# Altium integrated library Altium_Library_Harish.IntLib: 425 symbols (part 1 of 4) (continued)
## DIO-TVS_5.6V Vbr_18.6V Vc_9.4A Ip_SOD-923 (continued)
ESD Suppressor Diode TVS Bi-Dir 5V 18.6Vc 2-Pin SOD-923F T/R; Manufacturer: Comchip; Min Breakdown Voltage: 5.6V; Clamping Voltage: 7.3V; Peak Pulse Power: 174W; Power Line Protection: No; Peak Pulse Current: 9.4A; Diode Type: ZENER; Capacitance: 15pF; Number of Bidirectional Channels: 1; Supplier 1: Digi-Key; Manufacturer Part Number: CPDQ5V0-HF; RoHS: Yes; Category: TVS Diodes; Stock 1: 81421; Pricing 1: 1=0.31, 10=0.252, 100=0.1337, 500=0.08794, 1000=0.0598, 2000=0.05394 (USD); Mount: Surface Mount; Case/Package: 0402; Min Operating Temperature: -40°C; Max Operating Temperature: 125°C; Packaging: Tape and Reel; Package Quantity: 8000; Reverse Standoff Voltage: 5V; Breakdown Voltage: 5.6V; Series: -; Operating Supply Voltage: 5V; RoHS Compliant: Yes; ComponentLink1URL: https://datasheet.ciiva.com/6577/cpdq5v0-hf20reva825126-6577872.pdf?src-supplier=Digi-Key; ComponentLink1Description: https://datasheet.ciiva.com/6577/cpdq5v0-hf20reva825126-6577872.pdf?src-supplier=Digi-Key; ComponentLink2URL: https://datasheet.ciiva.com/12545/cpdq5v0-hf20reva825126-218795-12545530.pdf?src-supplier=Mouser; ComponentLink2Description: https://datasheet.ciiva.com/12545/cpdq5v0-hf20reva825126-218795-12545530.pdf?src-supplier=Mouser; Supplier 2: Digi-Key; Manufacturer 2: Comchip; Manufacturer Part Number 2: CPDQ5V0-HF; Stock 2: 80696; Pricing 2: 1=0.31, 10=0.214, 100=0.1042, 500=0.08692, 1000=0.0604, 2000=0.05235 (USD); Supplier Part Number 2: 641-1478-1-ND
footprint SOD-923F (SODFL, 2-Leads, Body 0.60x1.00mm, IPC Medium Density)
pins: 1, 2 "1"

## DIO-TVS_5V_7A_5Array_SC-89(SOT-666)
designator D?, comment UCLAMP0505A.TCT
Trans Voltage Suppressor Diode, 100W, 5V V(RWM), Unidirectional, 5 Element, Silicon; Manufacturer: Semtech; Package Body Material: Plastic; Min Breakdown Voltage: 6V; Clamping Voltage-Max: 12V; Number of Elements: 5; Qualification Status: Not Qualified; Supplier: Digi-Key; Supplier Part Number: UCLAMP0505ACT-ND; Manufacturer Part Number: UCLAMP0505A.TCT; RoHS: Yes; Category: TVS Diodes; Stock: 14139; Pricing: 1=0.76, 10=0.656, 100=0.4545, 500=0.37976, 1000=0.3232 (USD); Pins: 6; Diode Element Material: SILICON; Package Shape: Rectangular; Terminal Finish: Tin; Min Operating Temperature: -55°C; Max Operating Temperature: 125°C; JESD-609 Code: e3; Polarity: Unidirectional; Diode Type: TRANS VOLTAGE SUPPRESSOR; JESD-30 Code: R-PDSO-F6; Moisture Sensitivity Level: 1; Non-rep Peak Rev Power Dis-Max: 100W; Package Style: SMALL OUTLINEMeter; Peak Reflow Temperature (Cel): 260°C; Rep Pk Reverse Voltage-Max: 5V; Surface Mount: Yes; Technology: AVALANCHE; Terminal Form: Flat; Terminal Position: DUAL; Reach SVHC Compliant: Yes; RoHS Compliant: Yes; ComponentLink1URL: https://datasheet.ciiva.com:443/pdfs/VipMasterIC/IC/SEMT/SEMT-S-A0000084877/SEMT-S-A0000084877-1.pdf?src-supplier=IHS+Markit; ComponentLink1Description: https://datasheet.ciiva.com:443/pdfs/VipMasterIC/IC/SEMT/SEMT-S-A0000084877/SEMT-S-A0000084877-1.pdf?src-supplier=IHS+Markit; ComponentLink2URL: https://datasheet.ciiva.com/26837/getdatasheetpartid-215864-26837202.pdf?src-supplier=Verical; ComponentLink2Description: https://datasheet.ciiva.com/26837/getdatasheetpartid-215864-26837202.pdf?src-supplier=Verical; ComponentLink3URL: https://datasheet.ciiva.com/11195/uclamp0505a-11195109.pdf?src-supplier=Avnet; ComponentLink3Description: https://datasheet.ciiva.com/11195/uclamp0505a-11195109.pdf?src-supplier=Avnet
pins: 1, 2, 3, 4, 5, 6

## DIO_100V_215mA_SOD882D BAS16LD,315
designator D?  (value not drawn)
DIODE GP 100V 215MA SOD882D; Manufacturer: Nexperia; Manufacturer Part Number: BAS16LD,315; Supplier 1: Future Electronics; RoHS: Yes; Category: Rectifier Diodes; Stock 1: 50000; Pricing 1: 10000=0.0289, 30000=0.0279, 40000=0.0276, 100000=0.0268, 150000=0.026 (USD); Supplier 2: Digi-Key; Manufacturer 2: Nexperia; Manufacturer Part Number 2: BAS16LD,315; Stock 2: 431411; Pricing 2: 1=0.26, 10=0.215, 100=0.114, 500=0.075, 1000=0.05099, 2000=0.046, 5000=0.04 (USD); Supplier Part Number 2: 1727-4421-1-ND
footprint BAS16LD,315 Diode
pins: 1, 2
text: A; K

## DIO_ESD_USBLC6-25C6Y ESD Protection USB
designator D?, comment USBLC6-2SC6Y  (value not drawn)
USBLC6 Series 2 Line 6 V Uni / Bi-Directional ESD Protection - SOT-23-6; Manufacturer: STMicroelectronics; Direction: Unidirectional,Bidirectional; Reverse Standoff Voltage: 5.25V; Min Breakdown Voltage: 6V; Power Line Protection: Yes; Peak Pulse Current: 5A; Capacitance: 3.5pF; Clamping Voltage: 17V; Leakage Current: 150nA; Operating Supply Voltage: 1.1V; Number of Channels: 2; Working Voltage: 5V; Test Current: 1mA; Number of Elements: 1; Data Rate: 480Mbps; Supplier 1: Mouser; Manufacturer Part Number: USBLC6-2SC6; RoHS: Yes; Category: TVS Diodes; Stock 1: 215645; Pricing 1: 1=0.59, 10=0.507, 50=0.507, 100=0.379, 1000=0.23, 10000=0.182 (USD); Mount: Surface Mount; Case/Package: SOT-23; Number of Pins: 6; Min Operating Temperature: -40°C; Max Operating Temperature: 125°C; Packaging: Tape and Reel; Series: USB; Breakdown Voltage: 6V; Package Quantity: 3000; Termination: SMD/SMT; Number of Bidirectional Channels: 2; ESD Protection: Yes; Max Reverse Leakage Current: 150nA; Reverse Breakdown Voltage: 6V; Polarity: Unidirectional,Bidirectional; Max Breakdown Voltage: 6V; Clamping Voltage-Max: 17V; Length: 3.05mm; Width: 1.75mm; Height: 1.3mm; Depth: 1.75mm; Radiation Hardening: No; RoHS Compliant: Yes; Lead Free: Lead Free; Reach SVHC Compliant: No; ComponentLink1URL: https://datasheet.ciiva.com/1268/1690354-1268384.pdf?src-supplier=Element14; ComponentLink1Description: https://datasheet.ciiva.com/1268/1690354-1268384.pdf?src-supplier=Element14; ComponentLink2URL: https://datasheet.ciiva.com/4508/cd00050750-113117-4508433.pdf?src-supplier=Mouser; ComponentLink2Description: https://datasheet.ciiva.com/4508/cd00050750-113117-4508433.pdf?src-supplier=Mouser; ComponentLink3URL: https://datasheet.ciiva.com/15143/getdatasheetpartid-148465-15143789.pdf?src-supplier=Verical; ComponentLink3Description: https://datasheet.ciiva.com/15143/getdatasheetpartid-148465-15143789.pdf?src-supplier=Verical; ComponentLink4URL: https://datasheet.ciiva.com/16200/cd00050750-16200026.pdf?src-supplier=Future+Electronics; ComponentLink4Description: https://datasheet.ciiva.com/16200/cd00050750-16200026.pdf?src-supplier=Future+Electronics; ComponentLink5URL: https://datasheet.ciiva.com/41444/001184109-da-01-en-ic-esd-protecti-usblc6-2sc6-sot-23-6-stm-41444156.pdf?src-supplier=Conrad; ComponentLink5Description: https://datasheet.ciiva.com/41444/001184109-da-01-en-ic-esd-protecti-usblc6-2sc6-sot-23-6-stm-41444156.pdf?src-supplier=Conrad
pins: 1 I/O1 (io), 2 GND, 3 I/O2 (io), 4 I/O2, 5 VBUS, 6 I/O1 (io)

## DIO_REC_100V_200mA_SOD-323
designator DS?, comment BAS416-HF
Diode Switching 85V 200MA 250MW; Manufacturer: Comchip; Supplier: DigiKey; Supplier Part Number: 641-BAS416-HFCT-ND; Manufacturer Part Number: BAS416-HF; Stock: 2730; Pricing: 1=0.21, 10=0.146, 100=0.0711, 500=0.0593, 1000=0.04121 (USD)
footprint SOD-323
pins: 1, 2
text: A; K

## DIO_RECT_1000V_1A_DIO214AC
designator DS?, comment M7 1N4007
Diode 1000 V 1A Surface Mount SMA/DO-214AC
footprint DIO214AC
footprint DIO214AC
pins: 1, 2
text: A; K

## DIO_RECT_1000V_1A_DO-214AC
designator DS?, comment RS1M
Rectifier Diode, 1 Element, 1A, 1000V V(RRM), Silicon, DO-214AC; Manufacturer: ON Semiconductor / Fairchild; Reverse Recovery Time: 500ns; Max Reverse Voltage (DC): 1kV; Max Reverse Current: 5uA; Forward Voltage: 1.3V; Peak Non-Repetitive Surge Current: 30A; Polarity: Standard; Capacitance: 10pF; Power Dissipation: 1.19W; Supplier 1: Digi-Key; Manufacturer Part Number: RS1M; RoHS: Yes; Category: Rectifier Diodes; Stock 1: 700045; Pricing 1: 1=0.46, 10=0.345, 100=0.1954, 500=0.12938, 1000=0.09919, 2000=0.08626 (USD); Mount: Surface Mount; Case/Package: DO-214AC; Number of Pins: 2; Min Operating Temperature: -55°C; Max Operating Temperature: 150°C; Packaging: Tape and Reel; Series: -; Package Quantity: 7500; Average Rectified Current: 1A; Forward Current: 1A; Max Repetitive Reverse Voltage (Vrrm): 1kV; Max Surge Current: 30A; Voltage Rating (DC): 1kV; Output Current: 1A; Recovery Time: 500ns; Max Forward Surge Current (Ifsm): 30A; Current Rating: 1A; Voltage: 1kV; Reverse Voltage: 1kV; Current: 1A; Length: 4.75mm; Width: 2.95mm; Height: 2.2mm; Radiation Hardening: No; RoHS Compliant: Yes; Lead Free: Lead Free; Reach SVHC Compliant: No; ComponentLink1URL: https://datasheet.ciiva.com/15144/getdatasheetpartid-88045-15144615.pdf?src-supplier=Verical; ComponentLink1Description: https://datasheet.ciiva.com/15144/getdatasheetpartid-88045-15144615.pdf?src-supplier=Verical; ComponentLink2URL: https://datasheet.ciiva.com/25624/0900766b810e25bc-25624911.pdf?src-supplier=Rs; ComponentLink2Description: https://datasheet.ciiva.com/25624/0900766b810e25bc-25624911.pdf?src-supplier=Rs; ComponentLink3URL: https://datasheet.ciiva.com/5739/1766356-5739424.pdf?src-supplier=Farnell; ComponentLink3Description: https://datasheet.ciiva.com/5739/1766356-5739424.pdf?src-supplier=Farnell; ComponentLink4URL: https://datasheet.ciiva.com/4452/rs1m-192005-4452671.pdf?src-supplier=Mouser; ComponentLink4Description: https://datasheet.ciiva.com/4452/rs1m-192005-4452671.pdf?src-supplier=Mouser; ComponentLink5URL: https://datasheet.ciiva.com/910/rs1m-910528.pdf?src-supplier=Digi-Key; ComponentLink5Description: https://datasheet.ciiva.com/910/rs1m-910528.pdf?src-supplier=Digi-Key; ComponentLink6URL: https://datasheet.ciiva.com/22685/1766356-22685767.pdf?src-supplier=Element14; ComponentLink6Description: https://datasheet.ciiva.com/22685/1766356-22685767.pdf?src-supplier=Element14; ComponentLink7URL: https://datasheet.ciiva.com/910/rs1a-910526.pdf?src-supplier=Digi-Key; ComponentLink7Description: https://datasheet.ciiva.com/910/rs1a-910526.pdf?src-supplier=Digi-Key; Supplier Part Number 1: RS1MFSCT-ND
footprint DIO214AC
pins: 1, 2
text: A; K

## DIO_TVS_CAN_ESD_SOT23
designator D?, comment PESD2CAN,215
PESD Series 2 Channel Bi-Directional CAN Bus ESD Protection Diode - SOT-23; Manufacturer: Nexperia; Direction: Bidirectional; Breakdown Voltage: 30.3V; Clamping Voltage: 41V; Number of Channels: 1; Peak Pulse Current: 5A; Reverse Standoff Voltage: 24V; Supplier: Digikey; Supplier Part Number: 1727-3891-6-ND; Manufacturer Part Number: PESD2CAN,215; RoHS: No; Category: ESD and Circuit Protection ICs; Stock: 258317; Pricing: 1=0.49, 10=0.378, 100=0.227, 500=0.21016, 1000=0.14291 (USD); Pins: 3; Packaging: Tape and Reel; Operating Supply Voltage: 24V; Height: 1.1mm; ComponentLink1URL: http://www.farnell.com/datasheets/1750978.pdf?src-supplier=Farnell; ComponentLink1Description: http://www.farnell.com/datasheets/1750978.pdf?src-supplier=Farnell; ComponentLink2URL: https://assets.nexperia.com/documents/data-sheet/PESD2CAN.pdf?src-supplier=Digikey; ComponentLink2Description: https://assets.nexperia.com/documents/data-sheet/PESD2CAN.pdf?src-supplier=Digikey
footprint SOT23
pins: 1, 2 "1", 3 "1"

## FM Fiducial Markers
designator FM?  (value not drawn)  (no BOM)
Fiducial Markers for Pick and Place Machines
footprint Fiducial Markers

## IC_ALC5651
designator U?, comment ALC5651
Ultra-Low Power Two-Channel Audio CODEC / with SounzRealTM Digital Sound Effect / for Mobile Devices; Manufacturer: Realtek; Manufacturer Part Number: ALC5651; Case/Package: PQFA-45; Supplier-1: NA
footprint QFN40_15.7_227X227_SMD (QFN Package)
pins: 1 MICVDD, 2 MICBIAS1, 3 JD1, 4 IN1P/DMIC_DAT, 5 IN2P, 6 IN2N/JD2, 7 IN3P, 8 DACREF, 9 AVDD, 10 AGND, 11 VREF, 12 LOUTL/P, 13 LOUTR/N, 14 CPN2, 15 CPP2, 16 CPN1, 17 CPP1, 18 CPVDD, 19 CPVPP, 20 CPVREF, 21 HPO_R, 22 CPVEE, 23 HPO_L, 24 PDM_SDA, 25 PDM_SCL, 26 ADCDAT2, 27 DACDAT2, 28 LRCK2, 29 BCLK2, 30 ADCDAT1, 31 DACDAT1, 32 LRCK1, 33 BCLK1, 34 MCLK, 35 SCL, 36 SDA, 37 GPIO1/IRQ1, 38 GPIO2/DMIC_SCL, 39 DBVDD, 40 DCVDD, 41 PAD

## IC_AP6356S
designator U?, comment AP6356S
AMPAK Technology would like to announce a low-cost and low-power consumption module / which has all of the WiFi and Bluetooth functionalities.; Manufacturer: Rockchip; Manufacturer Part Number: AP6356S; Case/Package: NA; Supplier-1: Rockchip
footprint QFN127P600-8N (QFN Package)
pins: 1 GND, 2 WL/BT_ANT0 , 3 GND, 4 GND, 5 GND, 6 GND, 7 GND, 8 GND, 9 WL_ANT1, 10 GND, 11 GND, 12 PCIE_PERST, 13 XTAL_OUT, 14 XTAL_IN, 15 WL_REG_ON, 16 WL_HOST_WAKE, 17 SDIO_DATA_CMD, 18 SDIO_DATA_CLK, 19 SDIO_DATA_3, 20 SDIO_DATA_2, 21 SDIO_DATA_0, 22 SDIO_DATA_1, 23 GND, 24 PCIE_PME_L, 25 VIN_LDO, 26 VIN_LDO_OUT, 27 PCM_SYNC, 28 PCM_IN, 29 PCM_OUT, 30 PCM_CLK, 31 LPO, 32 GND, 33 PCIE_REFCLK_N, 34 VDDIO, 35 PCIE_REFCLK_P, 36 VBAT, 37 PCIE_CLKREQ_L, 38 BT_REG_ON, 39 GND, 40 UART_TXD, 41 UART_RXD, 42 UART_RTS_N, 43 UART_CTS_N, 44 PCIE_RDN, 45 PCIE_RDP, 46 PCIE_TDN, 47 PCIE_TDP, 48 GPIO8_9, 49 BT_WAKE, 50 BT_HOST_WAKE

## IC_AS5600
designator U?  (value not drawn)
AS5600 Series 5.5 V ±5% 12-bit Programmable Contactless Potentiometer - SOIC-8; Manufacturer: Osram; Manufacturer Part Number: AS5600-ASOM; Supplier 1: Avnet; RoHS: No; Stock 1: 19500; Pricing 1: 500=1.6576, 1000=1.6128, 2000=1.568, 3000=1.5232, 4000=1.4784, 5000=1.4336, 50000=1.3888 (USD); ComponentLink1URL: https://datasheet.octopart.com/AS5600-ASOM-Osram-datasheet-116051199.pdf?src-supplier=Future+Electronics; ComponentLink1Description: https://datasheet.octopart.com/AS5600-ASOM-Osram-datasheet-116051199.pdf?src-supplier=Future+Electronics
footprint SOIC8_1.27mm AS5600 (SOIC, 8-Leads, Body 4.90x3.90mm, Pitch 1.27mm, IPC Medium Density)
pins: 1 VDD5V, 2 VDD3V3, 3 OUT, 4 GND, 5 PGO, 6 SDA, 7 SCL, 8 DIR
text: AS5600

## IC_BNO055 IMU
designator U?
BNO055 Series 1.7 to 3.6 V Intelligent 9-Axis Absolute Orientation Sensor-LGA-28; Manufacturer: Bosch; Supplier 1: Future Electronics; Manufacturer Part Number: BNO055; RoHS: No; Category: Inertial Measurement Units (IMUs); Pricing 1: 4000=6.41 (USD); ComponentLink1URL: https://ae-bst.resource.bosch.com/media/_tech/media/application_notes/BST-BNO055-HS000.pdf ?src-supplier=Digi-Key; ComponentLink1Description: https://ae-bst.resource.bosch.com/media/_tech/media/application_notes/BST-BNO055-HS000.pdf ?src-supplier=Digi-Key; ComponentLink2URL: https://datasheet.octopart.com/BNO055-Bosch-Sensortec-datasheet-127364294.pdf?src-supplier=LKR; ComponentLink2Description: https://datasheet.octopart.com/BNO055-Bosch-Sensortec-datasheet-127364294.pdf?src-supplier=LKR
pins: 1 PIN1, 2 GND, 3 VDD, 4 nBOOT_LOAD, 5 PS1, 6 PS0, 7 SWDIO, 8 SWCLK, 9 CAP, 10 PIN10, 11 nRESET, 12 PIN12, 13 PIN13, 14 INT, 15 PIN15, 16 PIN16, 17 COM3, 18 COM2, 19 COM1, 20 COM0, 21 PIN21, 22 PIN22, 23 PIN23, 24 PIN24, 25 GNDIO, 26 XOUT32, 27 XIN32, 28 VDDIO

## IC_CANRXTX_TJA1042T/3118_SO-8
designator U?, comment TJA1042T/3,118
1/1 Transceiver Half CANbus 8-SO; Manufacturer: NXP Semiconductors; Package Body Material: Plastic; Data Rate: 1000Mbps; Channels: 1; Package Equivalence Code: SOP8,.25; Power Supplies: 5V; Max Supply Current: 70uA; Telecom IC Type: INTERFACE CIRCUIT; Qualification Status: Not Qualified; Supplier: Digikey; Supplier Part Number: 568-8678-6-ND; Manufacturer Part Number: TJA1042T/3,118; RoHS: Yes; Category: Interface ICs; Stock: 37083; Pricing: 1=1.78, 10=1.6, 25=1.5096, 100=1.2863, 250=1.20776, 500=1.05678, 1000=0.87562 (USD); Case/Package: SOP; Pins: 8; Package Shape: Rectangular; Terminal Finish: Nickel; Min Operating Temperature: -40°C; Max Operating Temperature: 125°C; JESD-609 Code: e4; JESD-30 Code: R-PDSO-G8; Moisture Sensitivity Level: 1; Number of Transceivers: 1; Package Style: SMALL OUTLINEMeter; Nominal Supply Voltage: 5V; Surface Mount: Yes; Terminal Form: Gull Wing; Terminal Position: DUAL; Length: 4.9mm; Width: 3.9mm; Height - Seated (Max): 1.75mm; Terminal Pitch: 1.27mm; Temperature Grade: AUTOMOTIVE; Reach SVHC Compliant: Yes; RoHS Compliant: Yes; ComponentLink1URL: https://datasheet.ciiva.com:443/pdfs/VipMasterIC/IC/PHGL/PHGLS24518/PHGLS24518-1.pdf?src-supplier=IHS+Markit; ComponentLink1Description: https://datasheet.ciiva.com:443/pdfs/VipMasterIC/IC/PHGL/PHGLS24518/PHGLS24518-1.pdf?src-supplier=IHS+Markit; ComponentLink2URL: https://datasheet.ciiva.com/4781/tja1042-120193-4781371.pdf?src-supplier=Mouser; ComponentLink2Description: https://datasheet.ciiva.com/4781/tja1042-120193-4781371.pdf?src-supplier=Mouser; ComponentLink3URL: https://datasheet.ciiva.com/15149/getdatasheetpartid-295270-15149994.pdf?src-supplier=Verical; ComponentLink3Description: https://datasheet.ciiva.com/15149/getdatasheetpartid-295270-15149994.pdf?src-supplier=Verical
footprint SO-8 (1.27mm pitch)
pins: 1 TXD, 2 GND, 3 Vcc, 4 RXD, 5 Vio, 6 CANL, 7 CANH, 8 STB

## IC_CP2102N QFN28
designator U?, comment CP2102N-A01-GQFN28
Full Speed USB to UART Bridge USB 2.0 3.3V Tube Automotive 28-Pin QFN EP; Manufacturer: Silicon Labs; Manufacturer Part Number: CP2102N-A02-GQFN28; Supplier 1: Rs; RoHS: Yes; Category: USB Interface ICs; Stock 1: 43
footprint QFN28_0.5mm CP2102N
pins: 1 DCD "1", 2 RI/CLK "1", 3 GND "1", 4 D+ "1", 5 D- "1", 6 VDD "1", 7 VREGIN "1", 8 VBUS "1", 9 RSTb "1", 10 NC "1", 11 SUSPENDb "1", 12 SUSPEND "1", 13 CHREN "1", 14 CHR1 "1", 15 CHR0 "1", 16 GPIO.3/WAKEUP "1", 17 GPIO.2/RS485 "1", 18 GPIO.1/RXT "1", 19 GPIO.0/TXT "1", 20 GPIO.6 "1", 21 GPIO.5 "1", 22 GPIO.4 "1", 23 CTS "1", 24 RTS "1", 25 RXD "1", 26 TXD "1", 27 DSR "1", 28 DTR "1", 29 PAD/GND "1"
text: CP2102N-QFN28

## IC_Current-Monitor_INA230AIRGTT
designator U?, comment INA230AIRGTT  (value not drawn)
Current Monitor Regulator High/Low-Side 16-VQFN (3x3); Manufacturer: Texas Instruments; Supplier 1: Mouser; Manufacturer Part Number: INA230AIRGTT; RoHS: Yes; Category: Amplifiers - Op Amps, Buffer, Instrumentation; Stock 1: 14; Pricing 1: 1=3.11, 10=2.79, 50=2.79, 100=2.29, 1000=1.64, 10000=1.51 (USD); ComponentLink1URL: https://datasheet.ciiva.com/4752/sbos601-126017-4752299.pdf?src-supplier=Mouser; ComponentLink1Description: https://datasheet.ciiva.com/4752/sbos601-126017-4752299.pdf?src-supplier=Mouser; ComponentLink2URL: https://datasheet.ciiva.com/2965/ina230-2965265.pdf?src-supplier=Avnet; ComponentLink2Description: https://datasheet.ciiva.com/2965/ina230-2965265.pdf?src-supplier=Avnet; ComponentLink3URL: https://datasheet.ciiva.com/25630/0900766b8119b045-25630794.pdf?src-supplier=Rs; ComponentLink3Description: https://datasheet.ciiva.com/25630/0900766b8119b045-25630794.pdf?src-supplier=Rs; ComponentLink4URL: https://datasheet.ciiva.com/15132/getdatasheetpartid-486929-15132660.pdf?src-supplier=Verical; ComponentLink4Description: https://datasheet.ciiva.com/15132/getdatasheetpartid-486929-15132660.pdf?src-supplier=Verical; ComponentLink5URL: https://datasheet.ciiva.com/2965/ina230-2965138.pdf?src-supplier=Avnet; ComponentLink5Description: https://datasheet.ciiva.com/2965/ina230-2965138.pdf?src-supplier=Avnet; ComponentLink6URL: https://datasheet.ciiva.com/1484/ina230-1484942.pdf?src-supplier=Element14; ComponentLink6Description: https://datasheet.ciiva.com/1484/ina230-1484942.pdf?src-supplier=Element14; ComponentLink7URL: https://datasheet.ciiva.com/6613/ina230-6613769.pdf?src-supplier=Digi-Key; ComponentLink7Description: https://datasheet.ciiva.com/6613/ina230-6613769.pdf?src-supplier=Digi-Key; ComponentLink8URL: https://datasheet.ciiva.com/6613/ina230-6613770.pdf?src-supplier=Digi-Key; ComponentLink8Description: https://datasheet.ciiva.com/6613/ina230-6613770.pdf?src-supplier=Digi-Key; ComponentLink9URL: https://datasheet.ciiva.com/6613/ina230-6613771.pdf?src-supplier=Digi-Key; ComponentLink9Description: https://datasheet.ciiva.com/6613/ina230-6613771.pdf?src-supplier=Digi-Key
pins: 1 A1 (in), 2 A0 (in), 3 ALERT, 4 SDA, 5 SCL (in), 6 NC_6, 7 NC_7, 8 NC_8, 9 VS, 10 GND, 11 BUS (in), 12 IN- (in), 13 IN+ (in), 14 NC_14, 15 NC_15, 16 NC_16, 17 PAD

## IC_Fuel_Gauge_MAX17262REWL+T
designator U?, comment Fuel Meter - Battery Indicator  (value not drawn)
MAX17262 Series 4.9 V 5.2 µA 1-Cell Ultra-Low Power Fuel-Gauge IC - WLP-9; Manufacturer: Maxim; Manufacturer Part Number: MAX17262REWL+T; Supplier 1: Digi-Key; Supplier Part Number 1: 175-MAX17262REWL+TCT-ND; RoHS: Yes; Category: Battery Management; Stock 1: 25772; Pricing 1: 1=2.89, 10=2.594, 25=2.4524, 100=2.1255, 250=2.01648, 500=1.8094, 1000=1.635 (USD); RoHS Compliant: Yes; ComponentLink1URL: http://www.farnell.com/datasheets/2842802.pdf?src-supplier=Farnell; ComponentLink1Description: http://www.farnell.com/datasheets/2842802.pdf?src-supplier=Farnell
footprint BGA_9_0.4mm_1.448_1.468 (MAX17262R)
pins: A1 TH "1", A2 BATT "1", A3 NC "1", B1 SCL (in) "1", B2 ALRT "1", B3 SYS "1", C1 SDA "1", C2 REG "1", C3 GND "1"
text: Battery Gauge

## IC_FUSB302MPX
designator U?, comment FUSB302MPX
USB Controller USB 3.1 USB Interface 14-MLP (2.5x2.5); Manufacturer: ON Semiconductor; Manufacturer Part Number: FUSB302MPX; Case/Package: 14-MLP; Supplier-1: Digikey
footprint MLP-14_98.4X98.4_SMD (MLP Package)
pins: 1 CC2_1, 2 VBUS, 3 NC1, 4 VDD, 5 INT, 6 SCL, 7 SDA, 8 NC2, 9 GND, 10 CC1_10, 11 CC1_11, 12 VCONN_12, 13 VCONN_13, 14 CC2_14, 15 ePAD

## IC_HX711_24BIT ADC_16SOIC
designator U?, comment HX711  (value not drawn)
24 BIT Analog to Digital Converter for weight scales
footprint SOIC16_1.27mm HX711
pins: 1 VSUP "1", 2 BASE "1", 3 AVDD "1", 4 VFB "1", 5 AGND "1", 6 VBG "1", 7 INA- "1", 8 INA+ "1", 9 INB- "1", 10 INB+ "1", 11 PD_SCK "1", 12 DOUT "1", 13 XO "1", 14 XI "1", 15 RATE "1", 16 DVDD "1"

## IC_IMU_BHI360
designator U?, comment BHI360  (value not drawn)
Accelerometer, Gyroscope, 6 Axis Sensor I²C, SPI Output; Manufacturer: Bosch Tools; Supplier 1: Mouser; Manufacturer Part Number: BHI360; RoHS: No; Category: Uncategorized; Stock 1: 452; Pricing 1: 1=6.54, 10=5.24, 50=5.24, 100=4.15, 1000=3.77, 10000=3.2 (USD)
footprint LGA20 (Bosch BHI360)
pins: 1 HSDO, 2 ASDX, 3 ASCX, 4 HIRQ, 5 VDDIO, 6 GNDIO, 7 GND, 8 VDD, 9 VREG, 10 OSCB, 11 OSDO, 12 HCSB, 13 HSCX, 14 HSDX, 15 M3SCL, 16 JTAG_DIO, 17 RESETIN, 18 M3SDA, 19 RESV2, 20 RESV1

## IC_IMU_BMM350_3 Axis Magnetometer
designator U?, comment BMM350  (value not drawn)
BMM350 Series 1.98 V I2C/I3C Interface 16 Bit 3 Axis Magnetometer - WLCSP-9; Manufacturer: Bosch Sensortec; Supplier 1: Future Electronics; Manufacturer Part Number: BMM350; RoHS: No; Category: Uncategorized
footprint BGA9 (BMM350)
pins: A1 INT, A2 SDA, A3 SCK, B1 GND, B2 ADSEL, B3 VDDIO, C1 VDD, C2 CRST, C3 BYPASS

## IC_IMU_ST_ASM330LHHTR_LGA-14L
designator U?, comment ASM330LHHTR
Accelerometer, Gyroscope, Temperature, 6 Axis Sensor I2C, SPI Output; Manufacturer: STMicroelectronics; Throw Configuration: ANALOG CIRCUIT; Supplier: Digikey; Supplier Part Number: 497-19078-1-ND; Manufacturer Part Number: ASM330LHHTR; RoHS: Yes; Category: Inertial Measurement Units (IMUs); Stock: 8175; Pricing: 1=11.49, 10=9.191, 25=8.502, 100=7.353, 500=6.8934, 1000=6.43384 (USD); Reach SVHC Compliant: Yes; RoHS Compliant: Yes; ComponentLink1URL: https://datasheet.ciiva.com:443/pdfs/VipMasterIC/IC/SGST/SGST-S-A0007768447/SGST-S-A0007768447-1.pdf?src-supplier=IHS+Markit; ComponentLink1Description: https://datasheet.ciiva.com:443/pdfs/VipMasterIC/IC/SGST/SGST-S-A0007768447/SGST-S-A0007768447-1.pdf?src-supplier=IHS+Markit; ComponentLink2URL: https://www.st.com/resource/en/datasheet/asm330lhh.pdf?src-supplier=Digikey; ComponentLink2Description: https://www.st.com/resource/en/datasheet/asm330lhh.pdf?src-supplier=Digikey
footprint LGA-14L
pins: 1 SDO/SA0, 2 RES, 3 RES, 4 INT1, 5 Vdd_IO, 6 GNSD (power), 7 GND (power), 8 Vdd (power), 9 INT2, 10 NC, 11 NC, 12 CS (in), 13 SCL (in), 14 SDA (io)

## IC_IMU_TDK_ICM-42670-P
designator U?, comment ICM-42670-P
Manufacturer: TDK; Supplier: Mouser; Supplier Part Number: 410-ICM-42670-P; Manufacturer Part Number: ICM-42670-P; RoHS: No; Stock: 7642; Pricing: 1=4.8, 10=3.07, 50=3.07, 100=2.98, 1000=2.33, 10000=2.18 (USD)

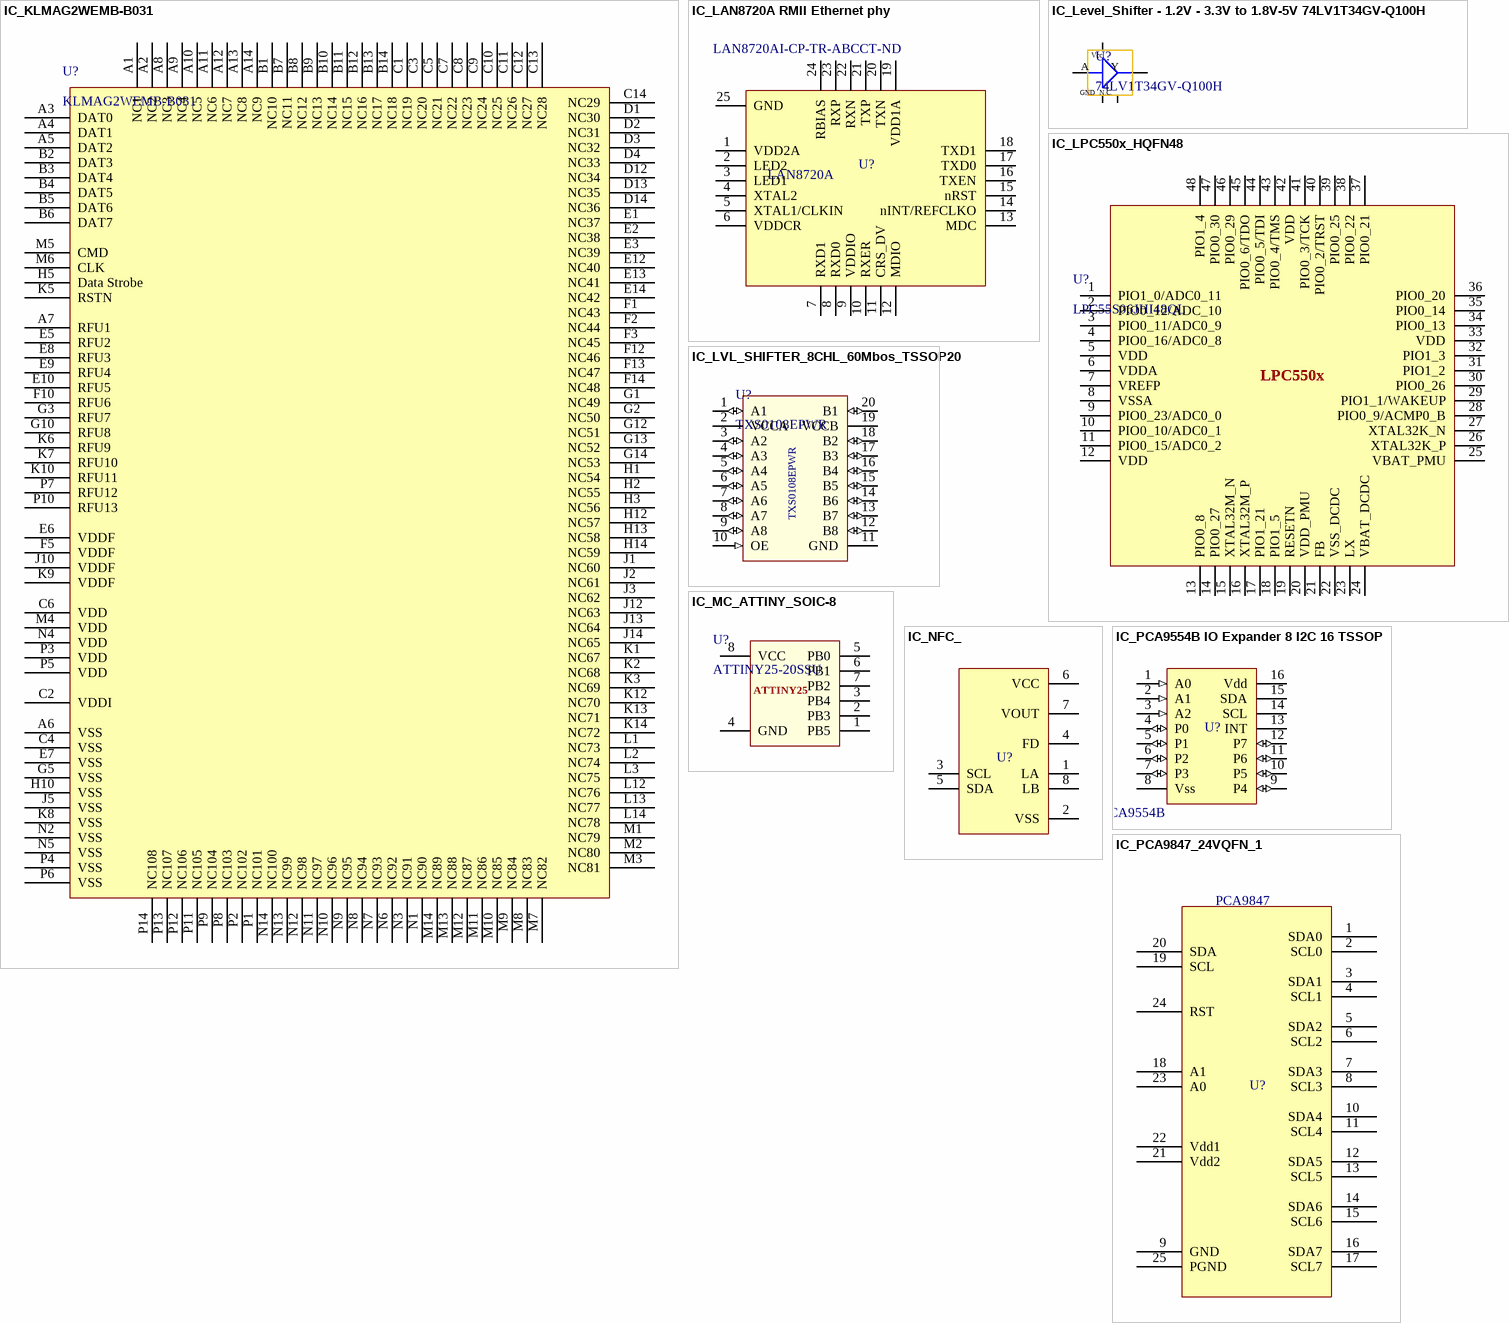
[diagram p4: symbols IC_KLMAG2WEMB-B031 to IC_PCA9847_24VQFN_1]

## IC_KLMAG2WEMB-B031
designator U?, comment KLMAG2WEMB-B031
16GB NAND Flash Memory; Manufacturer: Samsung Electronics; Manufacturer Part Number: KLMAG2WEMB-B031; Case/Package: 153-FBGA; Supplier-1: NA
footprint BGA153_IC_KLMAG2WEMB-B031
pins: A1 NC1, A2 NC2, A3 DAT0, A4 DAT1, A5 DAT2, A6 VSS, A7 RFU1, A8 NC3, A9 NC4, A10 NC5, A11 NC6, A12 NC7, A13 NC8, A14 NC9, B1 NC10, B2 DAT3, B3 DAT4, B4 DAT5, B5 DAT6, B6 DAT7, B7 NC11, B8 NC12, B9 NC13, B10 NC14, B11 NC15, B12 NC16, B13 NC17, B14 NC18, C1 NC19, C2 VDDI, C3 NC20, C4 VSS, C5 NC21, C6 VDD, C7 NC22, C8 NC23, C9 NC24, C10 NC25, C11 NC26, C12 NC27, C13 NC28, C14 NC29, D1 NC30, D2 NC31, D3 NC32, D4 NC33, D12 NC34, D13 NC35, D14 NC36, E1 NC37, E2 NC38, E3 NC39, E5 RFU2, E6 VDDF, E7 VSS, E8 RFU3, E9 RFU4, E10 RFU5, E12 NC40, E13 NC41, E14 NC42, F1 NC43, F2 NC44, F3 NC45, F5 VDDF, F10 RFU6, F12 NC46, F13 NC47, F14 NC48, G1 NC49, G2 NC50, G3 RFU7, G5 VSS, G10 RFU8, G12 NC51, G13 NC52, G14 NC53, H1 NC54, H2 NC55, H3 NC56, H5 Data Strobe, H10 VSS, H12 NC57, H13 NC58, H14 NC59, J1 NC60, J2 NC61, J3 NC62, J5 VSS, J10 VDDF, J12 NC63, J13 NC64, J14 NC65, K1 NC67, K2 NC68, K3 NC69, K5 RSTN, K6 RFU9, K7 RFU10, K8 VSS, K9 VDDF, K10 RFU11, K12 NC70, K13 NC71, K14 NC72, L1 NC73, L2 NC74, L3 NC75, L12 NC76, L13 NC77, L14 NC78, M1 NC79, M2 NC80, M3 NC81, M4 VDD, M5 CMD, M6 CLK, M7 NC82, M8 NC83, M9 NC84, M10 NC85, M11 NC86, M12 NC87, M13 NC88, M14 NC89, N1 NC90, N2 VSS, N3 NC91, N4 VDD, N5 VSS, N6 NC92, N7 NC93, N8 NC94, N9 NC95, N10 NC96, N11 NC97, N12 NC98, N13 NC99, N14 NC100, P1 NC101, P2 NC102, P3 VDD, P4 VSS, P5 VDD, P6 VSS, P7 RFU12, P8 NC103, P9 NC104, P10 RFU13, P11 NC105, P12 NC106, P13 NC107, P14 NC108

## IC_LAN8720A RMII Ethernet phy
designator U?  Supplier Part Number 1: LAN8720AI-CP-TR-ABCCT-ND  (hidden comment: *)
Small Footprint MII/RMII 10/100 Ethernet Transceiver with flexPWR Technology; Manufacturer: Microchip; Manufacturer Part Number: LAN8720AI-CP-TR-ABC; Data Rate: 100Mbps; Max Supply Voltage: 1.26V; Min Supply Voltage: 1.14V; Simplex/Duplex: Full Duplex; Number of Transceivers: 1; Operating Supply Voltage: 1.2V; Max Supply Current: 21mA; Supplier 1: Digi-Key; RoHS: Yes; Category: Ethernet Interface ICs; Pricing 1: 1=1.6, 25=1.37 (USD); Mount: Surface Mount; Case/Package: QFN; Number of Pins: 24; Weight: 0.032741oz; Min Operating Temperature: -40°C; Max Operating Temperature: 85°C; Packaging: Tape and Reel; Series: -; Package Quantity: 5000; RoHS Compliant: Yes; ComponentLink1URL: https://datasheet.ciiva.com/29644/lan8720a-lan8720ai-29644376.pdf?src-supplier=Digi-Key; ComponentLink1Description: https://datasheet.ciiva.com/29644/lan8720a-lan8720ai-29644376.pdf?src-supplier=Digi-Key
footprint QFN-24_0.5mm LAN8720A
pins: 1 VDD2A, 2 LED2, 3 LED1, 4 XTAL2, 5 XTAL1/CLKIN, 6 VDDCR, 7 RXD1, 8 RXD0, 9 VDDIO, 10 RXER, 11 CRS_DV, 12 MDIO, 13 MDC, 14 nINT/REFCLKO, 15 nRST, 16 TXEN, 17 TXD0, 18 TXD1, 19 VDD1A, 20 TXN, 21 TXP, 22 RXN, 23 RXP, 24 RBIAS, 25 GND
text: LAN8720A

## IC_Level_Shifter - 1.2V - 3.3V to 1.8V-5V 74LV1T34GV-Q100H
designator U?, comment 74LV1T34GV-Q100H
IC BUFFER NON-INVERT 5.5V SC74A / Buffer, Non-Inverting 1 Element 1 Bit per Element Push-Pull Output SC-74A
footprint SO70,5_0.65mm_2.00mm*1.25mm SN74LV1T34DCKR
pins: 1 N.C. "1", 2 A "1", 3 GND "1", 4 Y "1", 5 Vcc "1"

## IC_LPC550x_HQFN48
designator U?, comment LPC55S06JHI48QL
MCU 32-Bit ARM Cortex-M33 RISC 256kByte Flash 1.8V to 3.6V 48-Pin HVQFN Tray; Manufacturer: NXP Semiconductors; Supplier: Mouser; Supplier Part Number: 771-LPC55S06JHI48QL; Manufacturer Part Number: LPC55S06JHI48QL; RoHS: No; Category: Microcontrollers; Stock: 2605; Pricing: 1=6.51, 10=5.09, 50=5.09, 100=4.17, 1000=4.17, 10000=3.51 (USD)
pins: 1 PIO1_0/ADC0_11, 2 PIO0_12/ADC_10, 3 PIO0_11/ADC0_9, 4 PIO0_16/ADC0_8, 5 VDD, 6 VDDA, 7 VREFP, 8 VSSA, 9 PIO0_23/ADC0_0, 10 PIO0_10/ADC0_1, 11 PIO0_15/ADC0_2, 12 VDD, 13 PIO0_8, 14 PIO0_27, 15 XTAL32M_N, 16 XTAL32M_P, 17 PIO1_21, 18 PIO1_5, 19 RESETN, 20 VDD_PMU, 21 FB, 22 VSS_DCDC, 23 LX, 24 VBAT_DCDC, 25 VBAT_PMU, 26 XTAL32K_P, 27 XTAL32K_N, 28 PIO0_9/ACMP0_B, 29 PIO1_1/WAKEUP, 30 PIO0_26, 31 PIO1_2, 32 PIO1_3, 33 VDD, 34 PIO0_13, 35 PIO0_14, 36 PIO0_20, 37 PIO0_21, 38 PIO0_22, 39 PIO0_25, 40 PIO0_2/TRST, 41 PIO0_3/TCK, 42 VDD, 43 PIO0_4/TMS, 44 PIO0_5/TDI, 45 PIO0_6/TDO, 46 PIO0_29, 47 PIO0_30, 48 PIO1_4
text: LPC550x

## IC_LVL_SHIFTER_8CHL_60Mbos_TSSOP20
designator U?, comment TXS0108EPWR
Voltage Level Translator Bidirectional 1 Circuit 8 Channel 60Mbps 20-TSSOP; Manufacturer: Texas Instruments; Package Body Material: Plastic; Channels: 1; Interface IC Type: INTERFACE CIRCUIT; Package Equivalence Code: TSSOP20,.25; Power Supplies: 1.2/3.6,1.8/5V; Max Supply Voltage: 3.6V; Min Supply Voltage: 1.2V; Nominal Supply Voltage: 2.5V; Qualification Status: Not Qualified; Supplier: Digi-Key; Supplier Part Number: 296-23011-1-ND; Manufacturer Part Number: TXS0108EPWR; RoHS: Yes; Category: Voltage Level Shifters; Stock: 31750; Pricing: 1=1.5, 10=1.344, 25=1.2676, 100=1.08, 250=1.01404, 500=0.88728, 1000=0.73518 (USD); Case/Package: TSSOP; Pins: 20; Package Shape: Rectangular; Terminal Finish: Nickel; Min Operating Temperature: -40°C; Max Operating Temperature: 85°C; JESD-609 Code: e4; JESD-30 Code: R-PDSO-G20; Moisture Sensitivity Level: 1; Package Style: SMALL OUTLINE, THIN PROFILE, SHRINK PITCHMeter; Surface Mount: Yes; Terminal Form: Gull Wing; Terminal Position: DUAL; Peak Reflow Temperature (Cel): 260°C; Length: 6.5mm; Width: 4.4mm; Height - Seated (Max): 1.2mm; Terminal Pitch: 0.65mm; Temperature Grade: INDUSTRIAL; Reach SVHC Compliant: Yes; RoHS Compliant: Yes; ComponentLink1URL: https://www.ti.com:443/lit/ds/symlink/txs0108e.pdf?src-supplier=IHS+Markit; ComponentLink1Description: https://www.ti.com:443/lit/ds/symlink/txs0108e.pdf?src-supplier=IHS+Markit; ComponentLink2URL: https://datasheet.ciiva.com/14287/txs0108e-14287280.pdf?src-supplier=Farnell; ComponentLink2Description: https://datasheet.ciiva.com/14287/txs0108e-14287280.pdf?src-supplier=Farnell; ComponentLink3URL: https://datasheet.ciiva.com/28653/1714661-28653429.pdf?src-supplier=Element14; ComponentLink3Description: https://datasheet.ciiva.com/28653/1714661-28653429.pdf?src-supplier=Element14; ComponentLink4URL: https://datasheet.ciiva.com/1508/1815244-1508732.pdf?src-supplier=Element14; ComponentLink4Description: https://datasheet.ciiva.com/1508/1815244-1508732.pdf?src-supplier=Element14; ComponentLink5URL: https://datasheet.ciiva.com/1899/txs0108e-1899605.pdf?src-supplier=Digi-Key; ComponentLink5Description: https://datasheet.ciiva.com/1899/txs0108e-1899605.pdf?src-supplier=Digi-Key; ComponentLink6URL: https://datasheet.ciiva.com/1899/txs0108e-1899604.pdf?src-supplier=Digi-Key; ComponentLink6Description: https://datasheet.ciiva.com/1899/txs0108e-1899604.pdf?src-supplier=Digi-Key
footprint TSSOP20
pins: 1 A1 (io), 2 VCCA (power), 3 A2 (io), 4 A3 (io), 5 A4 (io), 6 A5 (io), 7 A6 (io), 8 A7 (io), 9 A8 (io), 10 OE (in), 11 GND (power), 12 B8 (io), 13 B7 (io), 14 B6 (io), 15 B5 (io), 16 B4 (io), 17 B3 (io), 18 B2 (io), 19 VCCB (power), 20 B1 (io)

## IC_MC_ATTINY_SOIC-8
designator U?, comment ATTINY25-20SSU
IC MCU 8BIT 2KB FLASH 8SOIC / MCU 8-bit AVR RISC 2KB Flash 3.3V/5V 8-Pin SOIC Tube; Manufacturer: Microchip; Supplier 1: Digikey; Manufacturer Part Number: ATTINY25-20SSU; RoHS: Yes; Stock 1: 15015; Pricing 1: 1=0.97, 25=0.9, 100=0.8 (USD); ComponentLink1URL: https://datasheet.ciiva.com/15122/getdatasheetpartid-64777-15122050.pdf?src-supplier=Verical; ComponentLink1Description: https://datasheet.ciiva.com/15122/getdatasheetpartid-64777-15122050.pdf?src-supplier=Verical; ComponentLink2URL: https://datasheet.ciiva.com/8010/1693899-8010713.pdf?src-supplier=Element14; ComponentLink2Description: https://datasheet.ciiva.com/8010/1693899-8010713.pdf?src-supplier=Element14; ComponentLink3URL: https://datasheet.ciiva.com/26207/2586-105-26207670.pdf?; ComponentLink3Description: https://datasheet.ciiva.com/26207/2586-105-26207670.pdf?; Supplier Part Number 1: ATTINY25-20SSU-ND
footprint SOIC8 (LV14360)
pins: 1 PB5, 2 PB3, 3 PB4, 4 GND, 5 PB0, 6 PB1, 7 PB2, 8 VCC
text: ATTINY25

## IC_NFC_
designator U?, comment NT3H2111_2211  (value not drawn)
RFID Transponder IC 13.56MHz ISO 14443 I²C 3.6V 8-XFQFN Exposed Pad
footprint IC_NT3H2211W0FHKH
pins: 1 LA "1", 2 VSS "1", 3 SCL "1", 4 FD "1", 5 SDA "1", 6 VCC "1", 7 VOUT "1", 8 LB "1"

## IC_PCA9554B IO Expander 8 I2C 16 TSSOP
designator U?  (value not drawn)
I2C/SMBus Interface 100kHz/400kHz 5.5V 16-Pin TSSOP T/R; Manufacturer: NXP Semiconductors; Manufacturer Part Number: PCA9554BPWJ; Interface: I2C,SMBus; Frequency: 400kHz; Number of I/Os: 8; Output Current: 25mA; Power Dissipation: 200mW; Max Frequency: 100kHz; Supplier 1: Digi-Key; RoHS: Yes; Category: Interface ICs; Stock 1: 4295; Pricing 1: 1=1.8, 10=1.619, 25=1.5272, 100=1.3012, 250=1.2218, 500=1.06906, 1000=0.8858 (USD); Mount: Surface Mount; Case/Package: TSSOP; Number of Pins: 16; Min Operating Temperature: -40°C; Max Operating Temperature: 85°C; Packaging: Tape and Reel; Package Quantity: 1; Series: -; Operating Supply Voltage: 5.5V; Lead Free: Lead Free; RoHS Compliant: Yes; ComponentLink1URL: https://datasheet.ciiva.com/6633/design-con-2003-tecforum-i2c-bus-overview-6633021.pdf?src-supplier=Digi-Key; ComponentLink1Description: https://datasheet.ciiva.com/6633/design-con-2003-tecforum-i2c-bus-overview-6633021.pdf?src-supplier=Digi-Key; ComponentLink2URL: https://datasheet.ciiva.com/6633/design-con-2003-tecforum-i2c-bus-overview-6633022.pdf?src-supplier=Digi-Key; ComponentLink2Description: https://datasheet.ciiva.com/6633/design-con-2003-tecforum-i2c-bus-overview-6633022.pdf?src-supplier=Digi-Key; ComponentLink3URL: https://datasheet.ciiva.com/6633/design-con-2003-tecforum-i2c-bus-overview-6633023.pdf?src-supplier=Digi-Key; ComponentLink3Description: https://datasheet.ciiva.com/6633/design-con-2003-tecforum-i2c-bus-overview-6633023.pdf?src-supplier=Digi-Key
footprint TSSOP16_SOT403-1 PCA9554B
pins: 1 A0 (in) "Address Input 0", 2 A1 (in) "Address Input 1", 3 A2 (in) "Address Input 2", 4 P0 (io) "Port P input/output 0", 5 P1 (io) "Port P input/output 1", 6 P2 (io) "Port P input/output 2", 7 P3 (io) "Port P input/output 3", 8 Vss "Supply Ground", 9 P4 (io) "Port P input/output 4", 10 P5 (io) "Port P input/output 5", 11 P6 (io) "Port P input/output 6", 12 P7 (io) "Port P input/output 7", 13 INT "Interrupt Output (Open Drain)", 14 SCL "Serial Clock LIne", 15 SDA "Serial Data Line", 16 Vdd "Supply Voltage"
text: PCA9554B

## IC_PCA9847_24VQFN_1
designator U?  (value not drawn)
I2C Switch with Reset 8 Channel Bi-Directional 1.65V to 5.25V 24-Pin VQFN Cut Tape
footprint VQFN_24 (PCA9847/TCA9548)
pins: 1 SDA0, 2 SCL0, 3 SDA1, 4 SCL1, 5 SDA2, 6 SCL2, 7 SDA3, 8 SCL3, 9 GND, 10 SDA4, 11 SCL4, 12 SDA5, 13 SCL5, 14 SDA6, 15 SCL6, 16 SDA7, 17 SCL7, 18 A1, 19 SCL, 20 SDA, 21 Vdd2, 22 Vdd1, 23 A0, 24 RST, 25 PGND
text: PCA9847

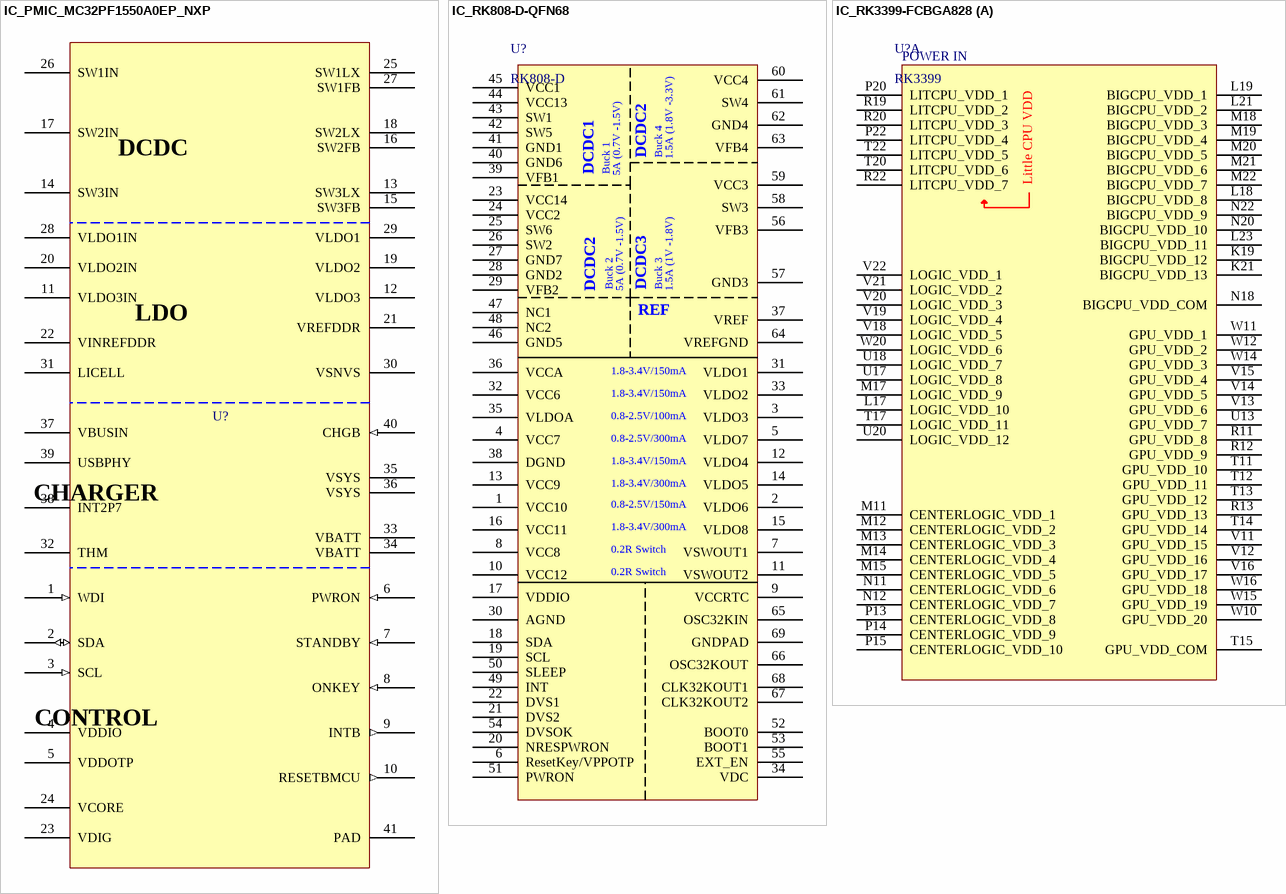
[diagram p5: symbols IC_PMIC_MC32PF1550A0EP_NXP to IC_RK3399-FCBGA828]